# Altium footprint library Footprint-1.PcbLib: 79 footprints (part 4 of 5)
Each footprint in its own frame and in the unit in brackets; x right, y up, seen from the top. Pads: shape width x height; smd on the part's side, far side on the other; paste and mask are expansions set on the pad; w line width, h text height; cw(c..) or ccw(c..) is an arc to the next point about the centre after c.
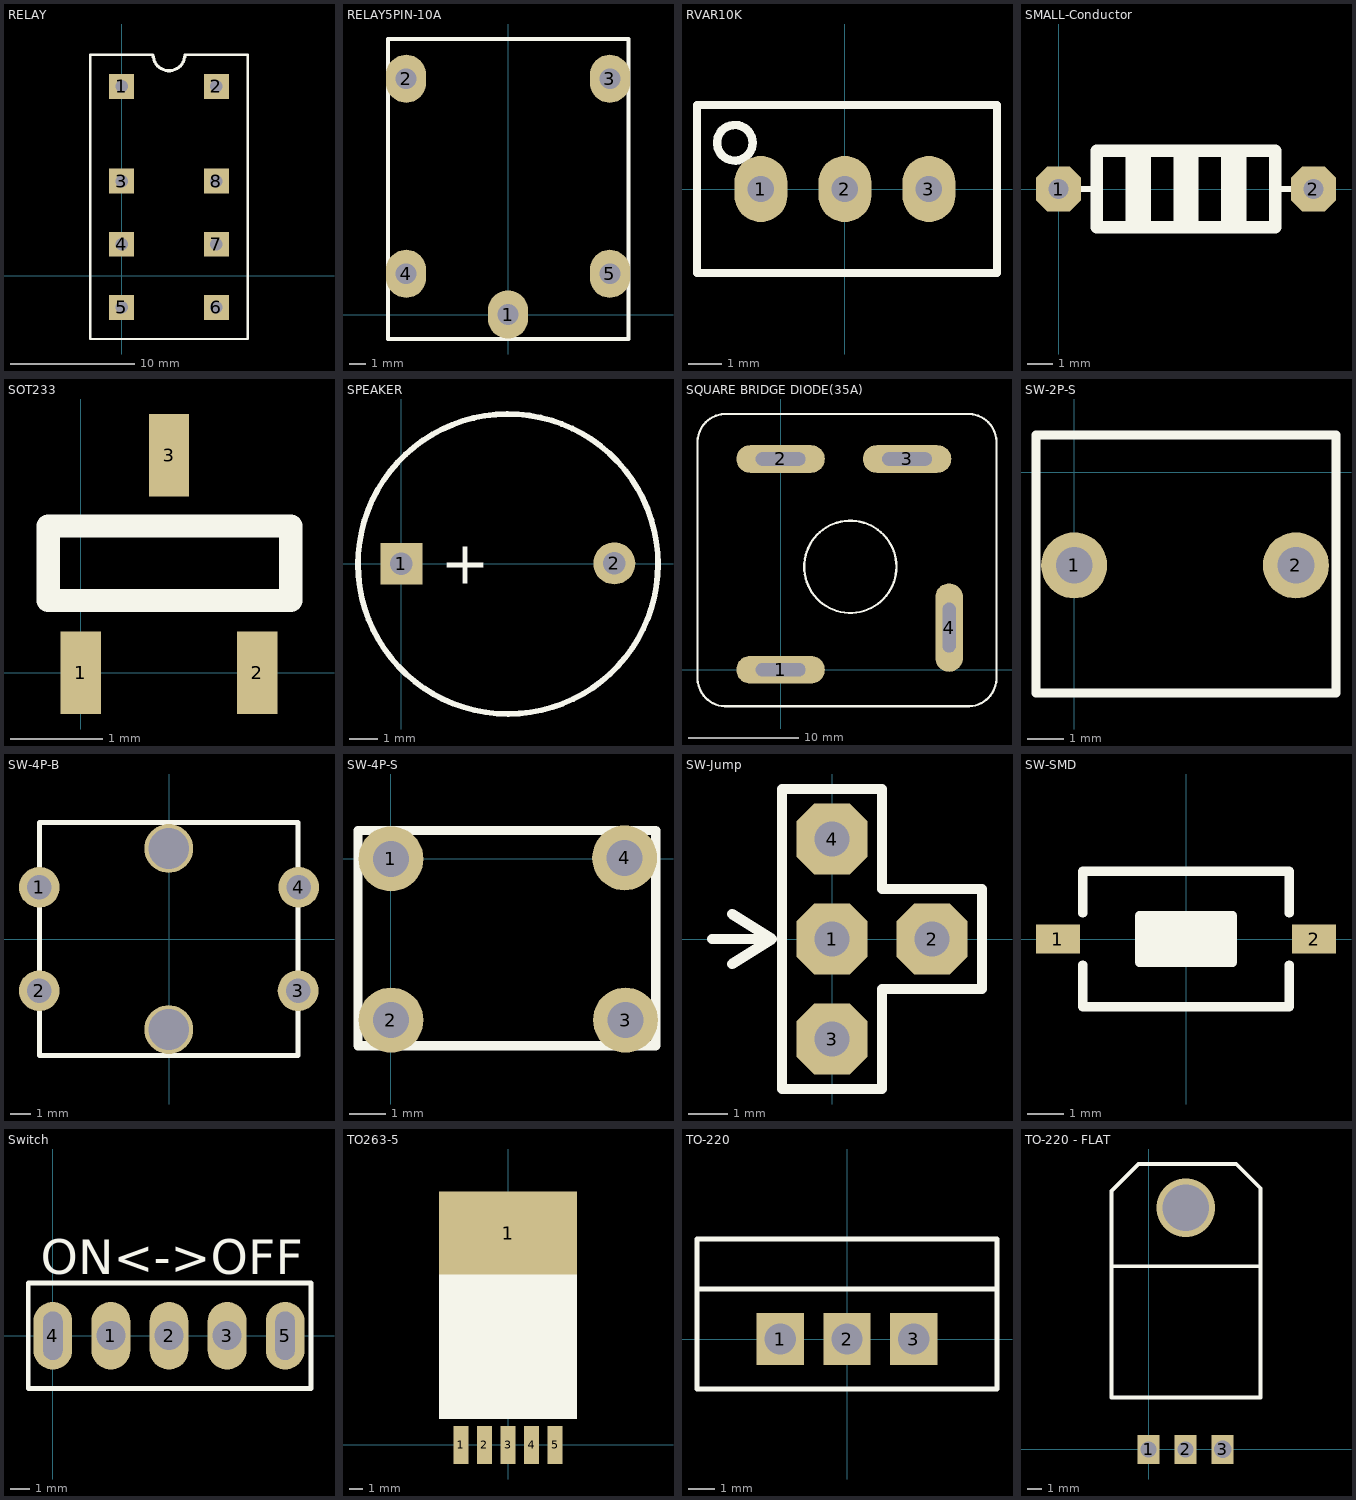
[diagram p3: the footprints below, top view; thin cyan lines are the x and y axes]

## RELAY [mm]
pads (8):
  rect 2x2 hole 1: 1(0,15.24) 2(7.62,15.24) 3(0,7.62) 4(0,2.54) 5(0,-2.54) 6(7.62,-2.54) 7(7.62,2.54) 8(7.62,7.62)
Top Overlay:
  lines w0.2: 2.413,17.78 -2.54,17.78 -2.54,-5.08 10.16,-5.08 10.16,17.78 5.08,17.78
  lines w0.254: 2.534,17.78 ccw(c3.81,17.78) 5.086,17.78
3D body: height 12.3, standoff -3, extent -1.09,-4.05 8.71,16.75

## RELAY5PIN-10A [mm]
pads (5):
  oval 2.5x3 hole 1.3: 1(0,0) 2(-6.35,14.7) 3(6.35,14.7) 4(-6.35,2.54) 5(6.35,2.54)
Top Overlay:
  lines w0.254: -7.493,-1.524 -7.493,17.176 7.507,17.176 7.507,-1.524 -7.493,-1.524
3D body: height 16, standoff 0, extent -7.493,-1.524 7.493,17.145

## RVAR10K [mm] "Bien tro vi chinh"
pads (3):
  oval 1.6x2 hole 0.8: 1(-2.54,0) 2(0,0) 3(2.54,0)
Top Overlay:
  circle w0.254: c-3.327,1.397 r0.539
  lines w0.254: -4.47,-2.54 4.597,-2.54 4.597,2.54 -4.47,2.54 -4.47,-2.54
3D body: height 12.02, standoff -5.48, extent -4.537,-2.4 4.663,2.4

## SMALL-Conductor [mm] "Small value conductor"
pads (2):
  oct 1.8x1.8 hole 0.8: 1(0,0) 2(10.16,0)
Top Overlay:
  rectangle: 6.477,-1.524 7.493,1.524
  rectangle: 2.667,-1.524 3.683,1.524
  rectangle: 4.572,-1.524 5.588,1.524
  lines w0.254: 0,0 1.524,0 ; 8.89,0 10.16,0
  lines w0.5: 1.524,-1.524 1.524,1.524 8.636,1.524 8.636,-1.524 1.524,-1.524

## SOT233 [mm]
pads (3):
  rect 0.44x0.9 smd: 1(0,0) 2(1.92,0) 3(0.96,2.37)
Top Overlay:
  lines w0.254: -0.356,0.787 2.286,0.787 2.286,1.6 -0.356,1.6 -0.356,0.787
3D body: height 1.04, standoff 0.02, extent -0.495,-0.051 2.425,2.425

## SPEAKER [mm]
pads (2):
  rect 1.5x1.5 hole 0.8: 1(0,0)
  round 1.5 hole 0.8: 2(7.62,0.013)
Top Overlay:
  lines w0.203: 7.724,3.67 ccw(c3.816,-0.008) 7.76,3.632
  text "+" at 1.41,-0.711 h1.52
3D body: height 4.5, standoff -9.65, extent -2.215,-6 13.239,6

## SQUARE BRIDGE DIODE(35A) [mm]
pads (4):
  oval 8x2.5 hole 1.2 slot 4.5 at 0 deg: 1(0,0) 2(0,19.05) 3(11.43,19.05)
  oval 2.5x8 hole 1.2 slot 4.5 at 90 deg: 4(15.24,3.81)
Top Overlay:
  circle w0.2: c6.303,9.304 r4.17
  lines w0.2: -7.504,-0.6 ccw(c-4.952,-0.75) -4.802,-3.302 16.808,-3.302 ccw(c16.958,-0.75) 19.509,-0.6 19.509,20.41 ccw(c16.958,20.56) 16.808,23.111 -4.802,23.111 ccw(c-4.952,20.56) -7.504,20.41 -7.504,-0.6
3D body: height 8.05, standoff -11, extent -8.281,-4.217 20.219,24.283

## SW-2P-S [mm]
height 5.59
pads (2):
  round 1.8 hole 1: 1(0,-2.54) 2(6.045,-2.54)
Top Overlay:
  lines w0.254: -1.041,-6.02 7.137,-6.02 7.137,1.016 -1.041,1.016 -1.041,-6.02

## SW-4P-B [mm] "Nut bam lon"
pads (6):
  round 2 hole 1.2: 1(-6.375,2.54) 2(-6.375,-2.54) 3(6.325,-2.54) 4(6.35,2.54)
  round 2.4 hole 2: ""(-0.025,-4.445) ""(-0.025,4.445)
Top Overlay:
  lines w0.254: -6.375,-5.715 6.325,-5.715 6.325,5.715 -6.375,5.715 -6.375,-5.715
3D body: height 9.5, standoff -3.5, extent -6.936,-6 6.937,6

## SW-4P-S [mm]
height 5.59
pads (4):
  round 1.8 hole 1: 1(0,0) 2(0,-4.47) 3(6.502,-4.47) 4(6.477,0.025)
Top Overlay:
  lines w0.254: -0.914,-5.182 7.341,-5.182 7.341,0.787 6.934,0.787 -0.914,0.787 -0.914,-5.182
3D body: height 9.52, standoff -3.48, extent -0.864,-5.235 7.348,0.765

## SW-Jump [mm]
pads (4):
  oct 1.8x1.8 hole 0.9: 1(0,0) 2(2.54,0) 3(0,-2.54) 4(0,2.54)
Top Overlay:
  lines w0.254: -3.048,0 -1.524,0 ; -2.54,-0.635 -1.524,0 ; -2.54,0.635 -1.524,0 ; -1.27,-3.81 -1.27,1.27 -1.27,-1.27 -1.27,3.81 1.27,3.81 1.27,1.27 3.81,1.27 3.81,-1.27 1.27,-1.27 1.27,-3.81 -1.27,-3.81

## SW-SMD [mm] "Switch SMD type"
pads (2):
  rect 1.2x0.8 smd: 1(-3.5,0) 2(3.5,0)
Top Overlay:
  rectangle: -1.27,-0.635 1.27,0.635
  lines w0.254: -2.819,-0.711 -2.819,-1.854 2.819,-1.854 2.819,-0.711 ; -2.819,0.711 -2.819,1.854 2.819,1.854 2.819,0.711 ; -1.27,-0.635 1.27,-0.635 1.27,0.635 -1.27,0.635 -1.27,-0.635
3D body: height 2.5, standoff 0, extent -3.05,-1.85 3.05,1.85

## Switch [mm]
pads (5):
  oval 2x3.5 hole 1.5: 1(3,0) 2(6,0) 3(9,0)
  oval 2x3.5 hole 1 slot 2.5 at 90 deg: 4(0,0) 5(12,0)
Top Overlay:
  lines w0.254: -1.27,-2.73 -1.27,2.73 13.335,2.73 13.335,-2.73 -1.27,-2.73
  text "ON<->OFF" at -0.635,3.175 h1.8
3D body: height 2.6, standoff -6, extent -0.5,-2.85 12.5,9.35

## TO263-5 [mm] "LM2576-SMD"
pads (6):
  rect 1.07x2.75 smd: 1(-3.4,-0.025) 2(-1.7,-0.025) 3(0,-0.025) 4(1.7,-0.025) 5(3.4,-0.025)
  rect 10x6 smd: 1(0,15.289)
Top Overlay:
  rectangle: -5,1.854 5,12.878
3D body: height 4.79, standoff -0.01, extent -5,-0.381 5,15.289

## TO-220 [mm]
pads (3):
  rect 1.8x2 hole 1.2: 1(-2.54,0) 2(0,0) 3(2.54,0)
Top Overlay:
  lines w0.2: -5.715,1.905 5.715,1.905 ; -5.715,-1.905 -5.715,2.54 -5.715,3.81 5.715,3.81 5.715,-1.905 -5.715,-1.905
3D body: height 8.08, standoff -20.7, extent -4.925,-2.134 4.975,2.366

## TO-220 - FLAT [mm]
pads (3):
  rect 1.5x2 hole 1.1: 1(0,0) 2(2.54,0)
  rect 1.5x2 hole 1.2: 3(5.08,0)
via 2.54,16.562 diameter 4 hole 3.2
Top Overlay:
  lines w0.254: -2.54,5.861 -2.54,17.71 -0.686,19.564 6.007,19.564 7.671,17.901 7.671,3.562 -2.54,3.562 -2.54,12.554 7.671,12.554
3D body: height 4.45, standoff -1.79, extent -2.54,-0.19 7.62,19.09